# Altium footprint library Components.PcbLib: 134 footprints (part 5 of 9)
Each footprint in its own frame and in the unit in brackets; x right, y up, seen from the top. Pads: shape width x height; smd on the part's side, far side on the other; paste and mask are expansions set on the pad; w line width, h text height; cw(c..) or ccw(c..) is an arc to the next point about the centre after c.
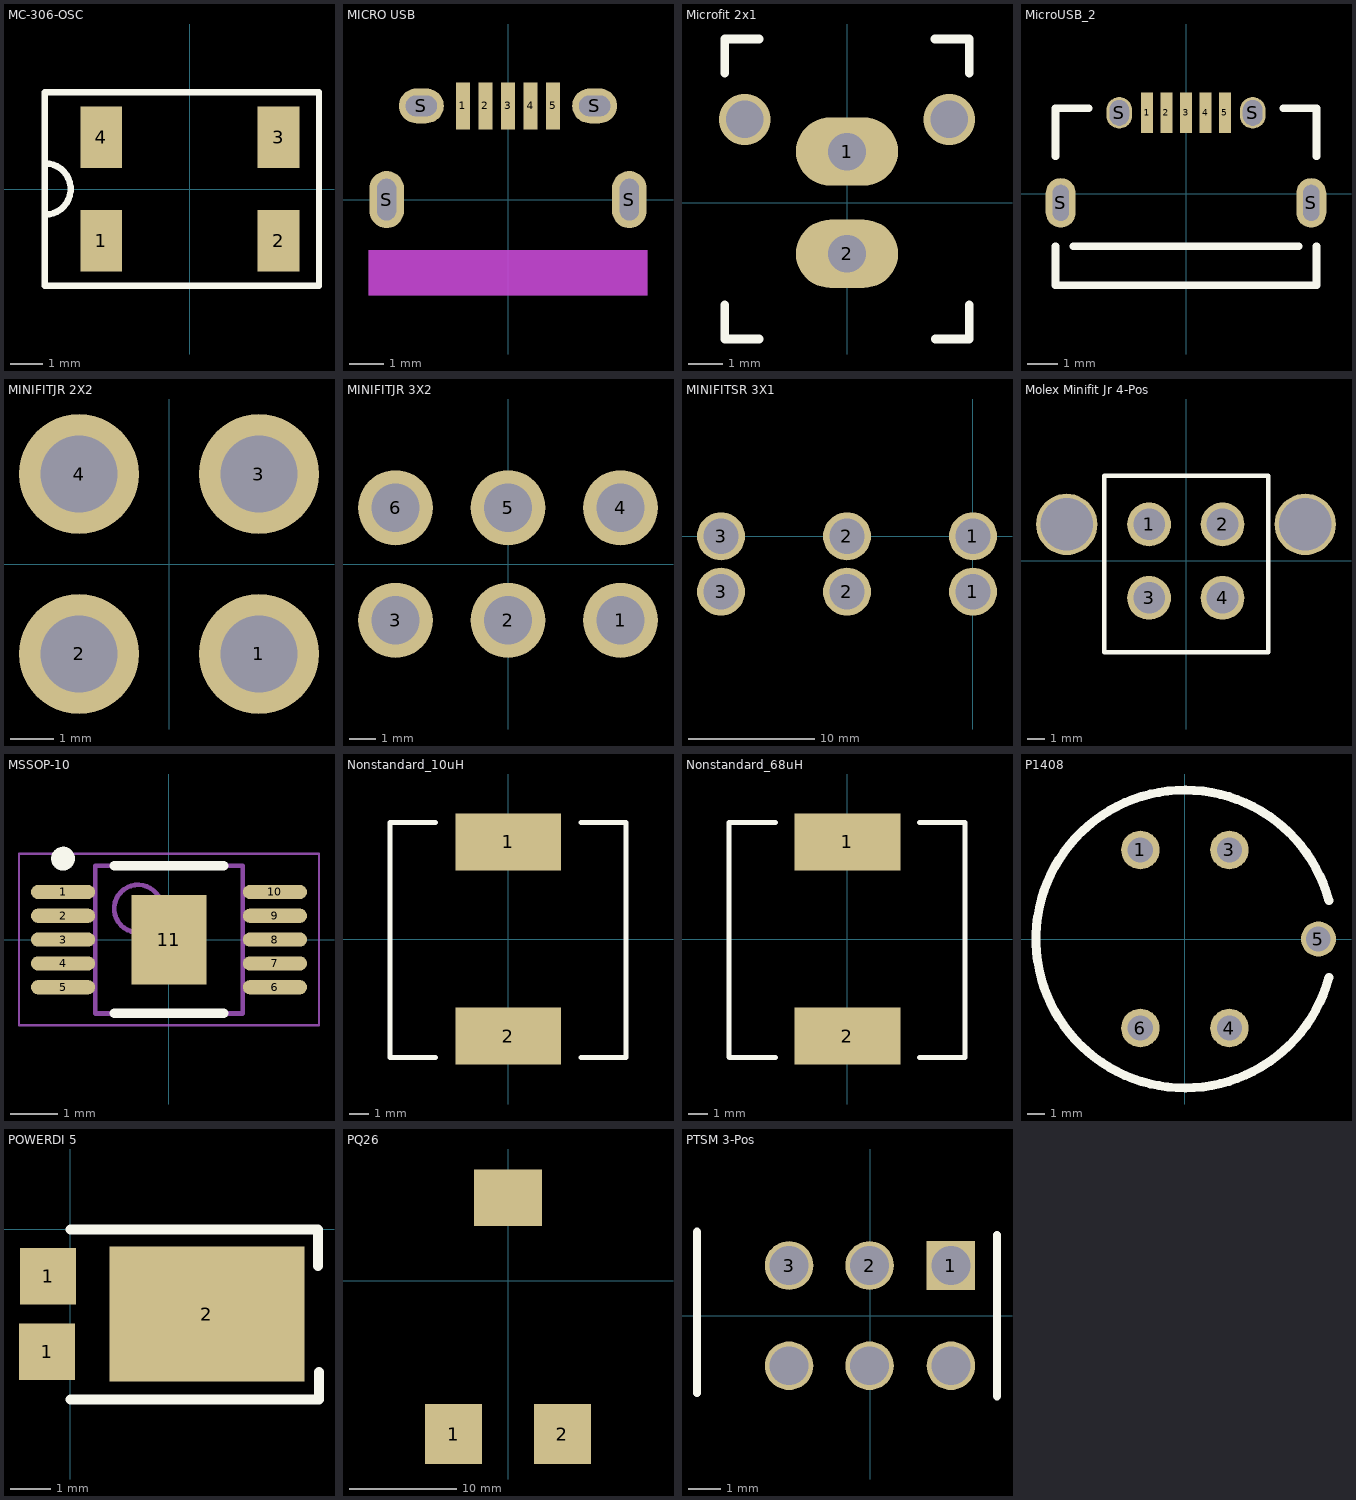
[diagram p4: the footprints below, top view; thin cyan lines are the x and y axes]

## MC-306-OSC [mm]
pads (4):
  rect 1.3x1.9 smd: 1(-2.75,-1.6) 2(2.75,-1.6) 3(2.75,1.6) 4(-2.75,1.6)
Top Overlay:
  lines w0.2: -4.5,-0.8 ccw(c-4.5,0) -4.5,0.8 ; -4.5,-3 -4.5,3 4,3 4,-3 -4.5,-3

## MICRO USB [mm]
pads (9):
  rect 0.4x1.35 smd mask+0.025: 1(-1.3,2.7) 2(-0.65,2.7) 3(0,2.7) 4(0.65,2.7) 5(1.3,2.7)
  oval 1x1.65 hole 0.55 slot 1.2 at 90 deg: S(-3.5,0) S(3.5,0)
  oval 1.3x1 hole 0.6 slot 0.9 at 0 deg mask+0.051: S(-2.5,2.7) S(2.5,2.7)
Mechanical 13 keep-out:
  rectangle: -4.025,-2.765 4.025,-1.45
3D body "micro usb.stp": height 2.74, standoff -0.53, extent -4.025,-2.667 4.025,2.913

## Microfit 2x1 [mm]
pads (2):
  oval 3x2 hole 1.1: 1(0,1.5) 2(0,-1.5)
via -3,2.44 diameter 1.5 hole 1.1
via 3,2.44 diameter 1.5 hole 1.1
Top Overlay:
  lines w0.254: -3.581,-3 -3.581,-4 -2.581,-4 ; -3.581,3.8 -3.581,4.8 -2.581,4.8 ; 2.581,4.8 3.581,4.8 3.581,3.8 ; 2.591,-4 3.581,-4 3.581,-3
3D body "Microfit3.0_Female.stp": height 17.6, standoff 3.6, extent -2.638,-3.83 2.642,7
3D body "Microfit3.0_Male.stp": height 9.95, standoff -3.14, extent -3.575,-3.97 3.575,4.8

## MicroUSB_2 [mm]
pads (9):
  rect 0.4x1.35 smd mask+0.025: 1(-1.3,2.7) 2(-0.65,2.7) 3(0,2.7) 4(0.65,2.7) 5(1.3,2.7)
  oval 1x1.65 hole 0.55 slot 1.2 at 90 deg: S(-4.175,-0.3) S(4.175,-0.3)
  oval 0.85x1.05 hole 0.85 slot 0.65 at 0 deg: S(-2.225,2.7) S(2.225,2.7)
Top Overlay:
  lines w0.254: -4.35,-1.75 -4.35,-3.05 4.35,-3.05 4.35,-1.75 ; -4.35,1.25 -4.35,2.85 -3.25,2.85 ; -3.75,-1.75 3.75,-1.75 ; 3.25,2.85 4.35,2.85 4.35,1.25
3D body "microusb.stp": height 2.69, standoff -0.62, extent -4.325,-3.05 4.325,2.844

## MINIFITJR 2X2 [mil]
pads (4):
  round 110 hole 71: 1(82.5,-82.5) 2(-82.5,-82.5) 3(82.5,82.5) 4(-82.5,82.5)
via -267.5,90 diameter 160 hole 118
via 267.5,90 diameter 160 hole 118
3D body "minifitjr2x2.stp": height 537.72, standoff -141.81, extent -327.95,-195.97 327.96,237.1

## MINIFITJR 3X2 [mil]
pads (6):
  round 110 hole 71: 1(165,-82.5) 2(0,-82.5) 3(-165,-82.5) 4(165,82.5) 5(0,82.5) 6(-165,82.5)
via 350,90 diameter 160 hole 118
via -350,90 diameter 160 hole 118
3D body "minifitjr3x2.stp": height 537.72, standoff -141.81, extent -410.62,-195.97 410.64,237.1

## MINIFITSR 3X1 [mil]
pads (6):
  round 150 hole 110: 1(0,-173) 1(0,0) 2(-393.7,-173) 2(-393.7,0) 3(-787.4,-173) 3(-787.4,0)
via -1012.99,-159 diameter 160 hole 118
via 226,-159 diameter 160 hole 118
3D body "minifitsr3x1.stp": height 819.01, standoff -147.52, extent -1059.74,-379.56 271.75,175.56

## Molex Minifit Jr 4-Pos [mm]
height 15
pads (6):
  round 2.5 hole 1.8: 1(-2.108,2.083) 2(2.083,2.083) 3(-2.108,-2.108) 4(2.083,-2.108)
  round 3.5 hole 3: ""(-6.807,2.083) ""(6.807,2.083)
Top Overlay:
  lines w0.254: -4.674,-5.207 4.699,-5.207 4.699,4.851 -4.674,4.851 -4.674,-5.207

## MountHole_M3 [mm]
via 0,0 diameter 6.35 hole 3.556
via 0,-2.54 diameter 1.016 hole 0.508
via 2.54,0 diameter 1.016 hole 0.508
via 0,2.54 diameter 1.016 hole 0.508
via -2.54,0 diameter 1.016 hole 0.508
3D body "M3x8 Philips Screw.stp": height 1.8, standoff -8, extent -2.65,-2.54 2.65,2.76

## MSSOP-10 [mm] "TSSOP, 10-Leads, Body 3.00x3.00mm, Pitch 0.50mm, Thermal Pad 1.88x1.57mm, IPC Medium Density"
height 1.1
pads (11):
  oval 1.35x0.3 smd: 1(-2.225,1) 2(-2.225,0.5) 3(-2.225,0) 4(-2.225,-0.5) 5(-2.225,-1) 6(2.225,-1) 7(2.225,-0.5) 8(2.225,0) 9(2.225,0.5) 10(2.225,1)
  rect 1.57x1.88 smd: 11(0,0)
Top Overlay:
  circle w0.25: c-2.225,1.7 r0.125
  lines w0.2: -1.15,-1.55 1.15,-1.55 ; -1.15,1.55 1.15,1.55
Mechanical 13:
  circle w0.1: c-0.65,0.65 r0.5
  lines w0.1: -1.55,-1.55 1.55,-1.55 1.55,1.55 -1.55,1.55 -1.55,-1.55
Mechanical 15:
  lines w0.05: -3.15,-1.8 3.15,-1.8 3.15,1.8 -3.15,1.8 -3.15,-1.8
  lines w0.1: -0.5,0 0.5,0 ; 0,-0.5 0,0.5
3D body "TSSOP50P490X110_HS-11N.step": height 1.1, standoff 0, extent -2.45,-1.55 2.45,1.55

## Nonstandard_10uH [mm]
pads (2):
  rect 5.4x2.9 smd: 1(0,4.95) 2(0,-4.95)
Top Overlay:
  lines w0.254: -3.708,-6.05 -6.02,-6.05 -6.02,5.95 -3.708,5.95 ; 3.708,-6.05 5.994,-6.05 5.994,5.95 3.708,5.95
3D body "Nonstandard_10uH.stp": height 5.97, standoff -0.03, extent -6,-6.05 6,5.95

## Nonstandard_68uH [mm]
pads (2):
  rect 5.4x2.9 smd: 1(0,4.95) 2(0,-4.95)
Top Overlay:
  lines w0.254: -3.683,-6.05 -6.02,-6.05 -6.045,-6.025 -6.045,5.95 -3.683,5.95 ; 3.683,-6.05 5.994,-6.05 5.994,5.95 3.683,5.95
3D body "Nonstandard_68uH.stp": height 9.45, standoff 0, extent -6,-6.05 6,5.95

## P1408 [mm]
pads (5):
  round 2.2 hole 1.45: 1(-2.54,5.08) 3(2.54,5.08) 4(2.54,-5.08) 6(-2.54,-5.08)
  round 2 hole 1.4: 5(7.62,0)
Top Overlay:
  lines w0.508: 8.21,-2.2 cw(c0,0) 8.21,2.2
3D body "P1408.step": height 12, standoff 0, extent -8.2,-8.2 8.2,8.2

## POWERDI 5 [mm]
pads (3):
  rect 1.4x1.4 smd: 1(-0.584,-3.048) 1(-0.559,-1.168)
  rect 4.86x3.36 smd: 2(3.404,-2.108)
Top Overlay:
  lines w0.254: 0,-4.242 6.198,-4.242 6.198,-3.556 ; 0,0 5.613,0 6.172,0 6.172,-0.914
3D body "PowerDI5.stp": height 0.56, standoff -0.54, extent -0.66,-4.119 5.984,-0.149

## PQ26 [mm]
pads (3):
  rect 5.33x5.59 smd: 1(-5.085,-14.36) 2(5.085,-14.36)
  rect 6.35x5.28 smd: ""(0,7.72)
3D body "PQ2614BLA.stp": height 15, standoff -0.1, extent -13.31,-16.35 13.49,10.825

## PTSM 3-Pos [mm]
pads (6):
  rect 1.5x1.5 hole 1.2: 1(2.489,1.549)
  round 1.5 hole 1.2: 2(-0.025,1.549) 3(-2.515,1.549) ""(-2.515,-1.549) ""(-0.025,-1.549) ""(2.489,-1.549)
Top Overlay:
  lines w0.254: -5.359,-2.388 -5.359,2.591 ; 3.912,-2.489 3.912,2.489
3D body "PTSM 3-Pos.stp": height 10.46, standoff -1.64, extent -4.877,-2.373 3.123,2.627